# Altium footprint library ZabugorLib.PcbLib: 42 footprints (part 3 of 3)
Each footprint in its own frame and in the unit in brackets; x right, y up, seen from the top. Pads: shape width x height; smd on the part's side, far side on the other; paste and mask are expansions set on the pad; w line width, h text height; cw(c..) or ccw(c..) is an arc to the next point about the centre after c.
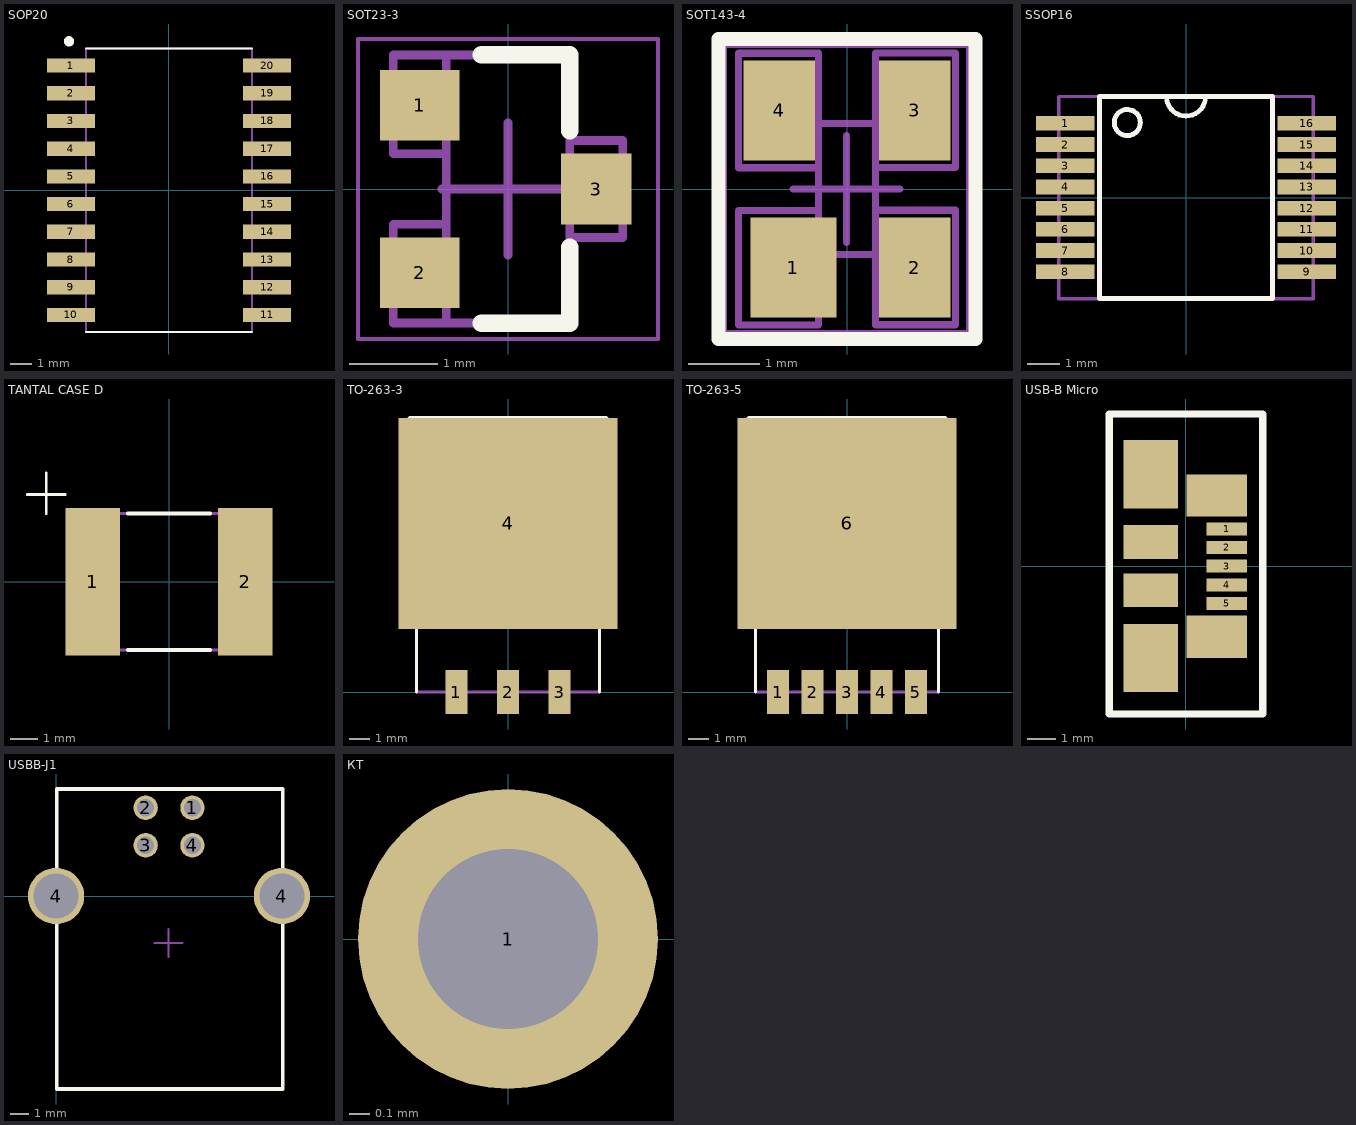
[diagram p2: the footprints below, top view; thin cyan lines are the x and y axes]

## SOP20 [mm]
pads (20):
  rect 2.2x0.65 smd: 1(-4.5,5.715) 2(-4.5,4.445) 3(-4.5,3.175) 4(-4.5,1.905) 5(-4.5,0.635) 6(-4.5,-0.635) 7(-4.5,-1.905) 8(-4.5,-3.175) 9(-4.5,-4.445) 10(-4.5,-5.715) 11(4.5,-5.715) 12(4.5,-4.445) 13(4.5,-3.175) 14(4.5,-1.905) 15(4.5,-0.635) 16(4.5,0.635) 17(4.5,1.905) 18(4.5,3.175) 19(4.5,4.445) 20(4.5,5.715)
Top Overlay:
  circle w0.254: c-4.581,6.825 r0.106
  lines w0.1: -3.8,-6.5 3.8,-6.5 ; -3.8,6.5 3.8,6.5
Mechanical 7:
  lines w0.1: -3.8,-6.5 -3.8,6.5 3.8,6.5 3.8,-6.5 -3.775,-6.5
3D body: height 2.65, standoff 0, extent -3.8,-6.5 3.8,6.5

## SOT23-3 [mm]
height 1.12
pads (3):
  rect 0.9x0.8 smd: 1(-1,0.95) 2(-1,-0.95)
  rect 0.8x0.8 smd: 3(1,0)
Top Overlay:
  lines w0.2: -0.3,-1.52 0.7,-1.52 0.7,-0.66 ; -0.3,1.52 0.7,1.52 0.7,0.66
Mechanical 9:
  text ".Comment" at -0.75,-0.5 h0.8
  text ".Designator" at -0.75,0.25 h1
Mechanical 11:
  lines w0.1: -0.7,-1.52 -0.7,1.52 ; -0.7,-0.4 -1.3,-0.4 -1.3,-1.52 0.7,-1.52 0.7,1.52 -1.3,1.52 -1.3,0.4 -0.7,0.4 ; 0.7,-0.55 1.3,-0.55 1.3,0.55 0.7,0.55
Mechanical 15:
  lines w0.05: -1.7,-1.7 -1.7,1.7 1.7,1.7 1.7,-1.7 -1.7,-1.7
  lines w0.1: -0.75,0 0.75,0 ; 0,-0.75 0,0.75
3D body "SOT-23-3.STEP": height 1.1, standoff 0, extent -1.15,-1.5 1.15,1.5

## SOT143-4 [mm]
height 1.12
pads (4):
  rect 1.2x1.4 smd: 1(-0.75,-1.1)
  rect 1x1.4 smd: 2(0.95,-1.1) 3(0.95,1.1) 4(-0.95,1.1)
Top Overlay:
  lines w0.2: -1.8,-2.1 -1.8,2.1 1.8,2.1 1.8,-2.1 -1.8,-2.1
Mechanical 9:
  text ".Designator" at 10.287,-3.937 h1
  text ".Comment" at 11.049,-3.175 h0.8
Mechanical 11:
  lines w0.1: -0.4,-0.917 0.4,-0.917 ; -0.4,-0.9 -0.4,1.9 -1.518,1.9 -1.518,0.297 -0.4,0.297 ; -0.4,0.917 0.4,0.917 ; 0.4,0.3 1.518,0.3 1.518,1.903 0.4,1.903 ; 0.4,1.9 0.4,-0.297 ; 0.4,-0.297 1.518,-0.297 1.518,-1.9 0.4,-1.9 0.4,-0.297 ; -1.518,-1.903 -1.518,-0.3 -0.4,-0.3 -0.4,-1.903 -1.518,-1.903
Mechanical 15:
  lines w0.05: -1.706,-2 1.694,-2 1.694,2 -1.706,2 -1.706,-2
  lines w0.1: -0.756,0 0.744,0 ; -0.006,-0.75 -0.006,0.75
3D body "User Library-sot143.step": height 1, standoff 0, extent -1.46,-1.21 1.46,1.21

## SSOP16 [mm]
height 1.99
pads (16):
  rect 1.8x0.45 smd: 1(-3.7,2.275) 2(-3.7,1.625) 3(-3.7,0.975) 4(-3.7,0.325) 5(-3.7,-0.325) 6(-3.7,-0.975) 7(-3.7,-1.625) 8(-3.7,-2.275) 9(3.7,-2.275) 10(3.7,-1.625) 11(3.7,-0.975) 12(3.7,-0.325) 13(3.7,0.325) 14(3.7,0.975) 15(3.7,1.625) 16(3.7,2.275)
Top Overlay:
  circle w0.15: c-1.8,2.3 r0.4
  lines w0.15: -0.6,3.1 ccw(c0,3.1) 0.6,3.09 ; -2.65,-3.1 2.65,-3.1 2.65,3.1 -2.65,3.1 -2.65,-3.1
Mechanical 7:
  lines w0.1: -2.65,-3.1 -2.65,3.1 ; -0.6,3.1 ccw(c0,3.1) 0.6,3.09 ; 2.65,-3.1 2.65,3.1 ; -3.9,-3.1 3.9,-3.1 3.9,3.1 -3.9,3.1 -3.9,-3.1
Mechanical 10:
  text ".Comment" at -0.67,-3.72 h0.6
  text ".Designator" at -1.23,3.46 h0.8
3D body "User Library-ssop-16 pos.step": height 1.97, standoff -0.01, extent -3.95,-3.162 3.95,3.162

## TANTAL CASE D [mm] "Конденсатор танталовый SMD"
height 1.8
pads (2):
  rect 2x5.4 smd: 1(-2.8,0) 2(2.8,0)
Top Overlay:
  lines w0.1: -5.2,3.2 -3.8,3.2 ; -4.5,2.5 -4.5,4
  lines w0.15: -1.5,-2.5 1.5,-2.5 ; -1.5,2.5 1.5,2.5
Mechanical 7:
  lines w0.1: -2.8,-2.5 -2.8,2.5 2.8,2.5 2.8,-2.5 -2.8,-2.5
Mechanical 10:
  text ".Designator" at -0.56,3.04 h0.8
  text ".Comment" at -0.47,-3.45 h0.6
3D body "User Library-CAP_TANT_7343-40.step": height 4, standoff 0, extent -3.8,-2.3 3.8,2.3

## TO-263-3 [mm]
pads (4):
  rect 1.07x2.16 smd: 1(-2.54,0) 2(0,0) 3(2.54,0)
  rect 10.8x10.41 smd: 4(0,8.315)
Top Overlay:
  lines w0.15: -5.258,12.27 5.232,12.27 ; -4.51,0 -4.51,3.7 ; 4.51,0 4.51,3.7 ; -5.258,3.7 5.232,3.7 5.232,13.168 4.86,13.54 -4.86,13.54 -5.258,13.142 -5.258,3.7
Mechanical 7:
  lines w0.15: -5.25,12.27 -5.25,3.7 5.25,3.7 5.25,12.27 ; -4.51,3.7 -4.51,0 4.51,0 4.51,3.7 ; -5.1,12.27 -5.1,12.4 -3.96,13.54 3.962,13.54 5.232,12.27 -5.1,12.27
Mechanical 10:
  text ".Comment" at -1.3,17 h0.7
  text ".Designator" at -1.3,-2.8 h0.7
3D body "User Library-D?PAK TO-263-3.step": height 4.87, standoff 0, extent -5.07,-0.89 5.09,13.34

## TO-263-5 [mm]
pads (6):
  rect 1.07x2.16 smd: 1(-3.4,0) 2(-1.7,0) 3(0,0) 4(1.7,0) 5(3.4,0)
  rect 10.8x10.41 smd: 6(0,8.315)
Top Overlay:
  lines w0.15: -5.258,12.27 5.232,12.27 ; -4.51,0 -4.51,3.7 ; 4.51,0 4.51,3.7 ; -5.258,3.7 -5.258,13.142 -4.86,13.54 4.86,13.54 5.232,13.168 5.232,3.7 -5.258,3.7
Mechanical 7:
  lines w0.15: -5.25,12.27 -5.25,3.7 5.25,3.7 5.25,12.27 ; -4.51,3.7 -4.51,0 4.51,0 4.51,3.7 ; -5.1,12.27 5.232,12.27 3.962,13.54 -3.96,13.54 -5.1,12.4 -5.1,12.27
Mechanical 10:
  text ".Designator" at -1.3,-2.8 h0.7
  text ".Comment" at -1.3,17 h0.7
3D body: height 4.58, standoff 0, extent -5.08,-0.9 5.1,13.45

## USB-B Micro [mm]
pads (11):
  rect 1.4x0.45 smd: 1(1.425,1.3) 2(1.425,0.65) 3(1.425,0) 4(1.425,-0.65) 5(1.425,-1.3)
  rect 1.9x2.375 smd: ""(-1.225,-3.2) ""(-1.225,3.2)
  rect 1.9x1.175 smd: ""(-1.225,-0.837) ""(-1.225,0.837)
  rect 2.1x1.475 smd: ""(1.075,-2.462) ""(1.075,2.462)
Top Overlay:
  lines w0.254: -2.665,-5.15 -2.665,5.3 2.675,5.3 2.675,-5.15 -2.665,-5.15
3D body "micro-B USB.STEP": height 2.64, standoff -0.28, extent -3.925,-3.974 1.501,4

## USBB-J1 [mm]
pads (6):
  round 1.3 hole 0.92: 1(7.27,4.71) 2(4.77,4.71) 3(4.77,2.71) 4(7.27,2.71)
  round 3 hole 2.4: 4(0,0) 4(12.04,0)
Top Overlay:
  lines w0.2: 12.04,5.71 0.04,5.71 0.04,-10.29 12.08,-10.29 12.08,5.71
Mechanical 9:
  text ".Designator" at 5.25,-2.25 h1
  text ".Comment" at 5.25,-3.25 h0.8
Mechanical 11:
  lines w0.1: 12.04,5.71 0.04,5.71 0.04,-10.29 12.08,-10.29 12.08,5.71
Mechanical 15:
  lines w0.05: 12,5.71 0,5.71 0,-10.29 12.04,-10.29 12.04,5.71
  lines w0.1: 5.25,-2.5 6.75,-2.5 ; 6,-3.25 6,-1.75
3D body "User Library-Samtec - USB-B-S-X-W-TH.STEP": height 11, standoff -3.64, extent -1.398,-10.3 13.4,6.2

## КТ [mm] "Контрольная точка"
pads (1):
  round 1.5 hole 0.9: 1(0,0)